# Altium footprint library PBL - THD Packages.PcbLib: 256 footprints (part 9 of 16)
Each footprint in its own frame and in the unit in brackets; x right, y up, seen from the top. Pads: shape width x height; smd on the part's side, far side on the other; paste and mask are expansions set on the pad; w line width, h text height; cw(c..) or ccw(c..) is an arc to the next point about the centre after c.
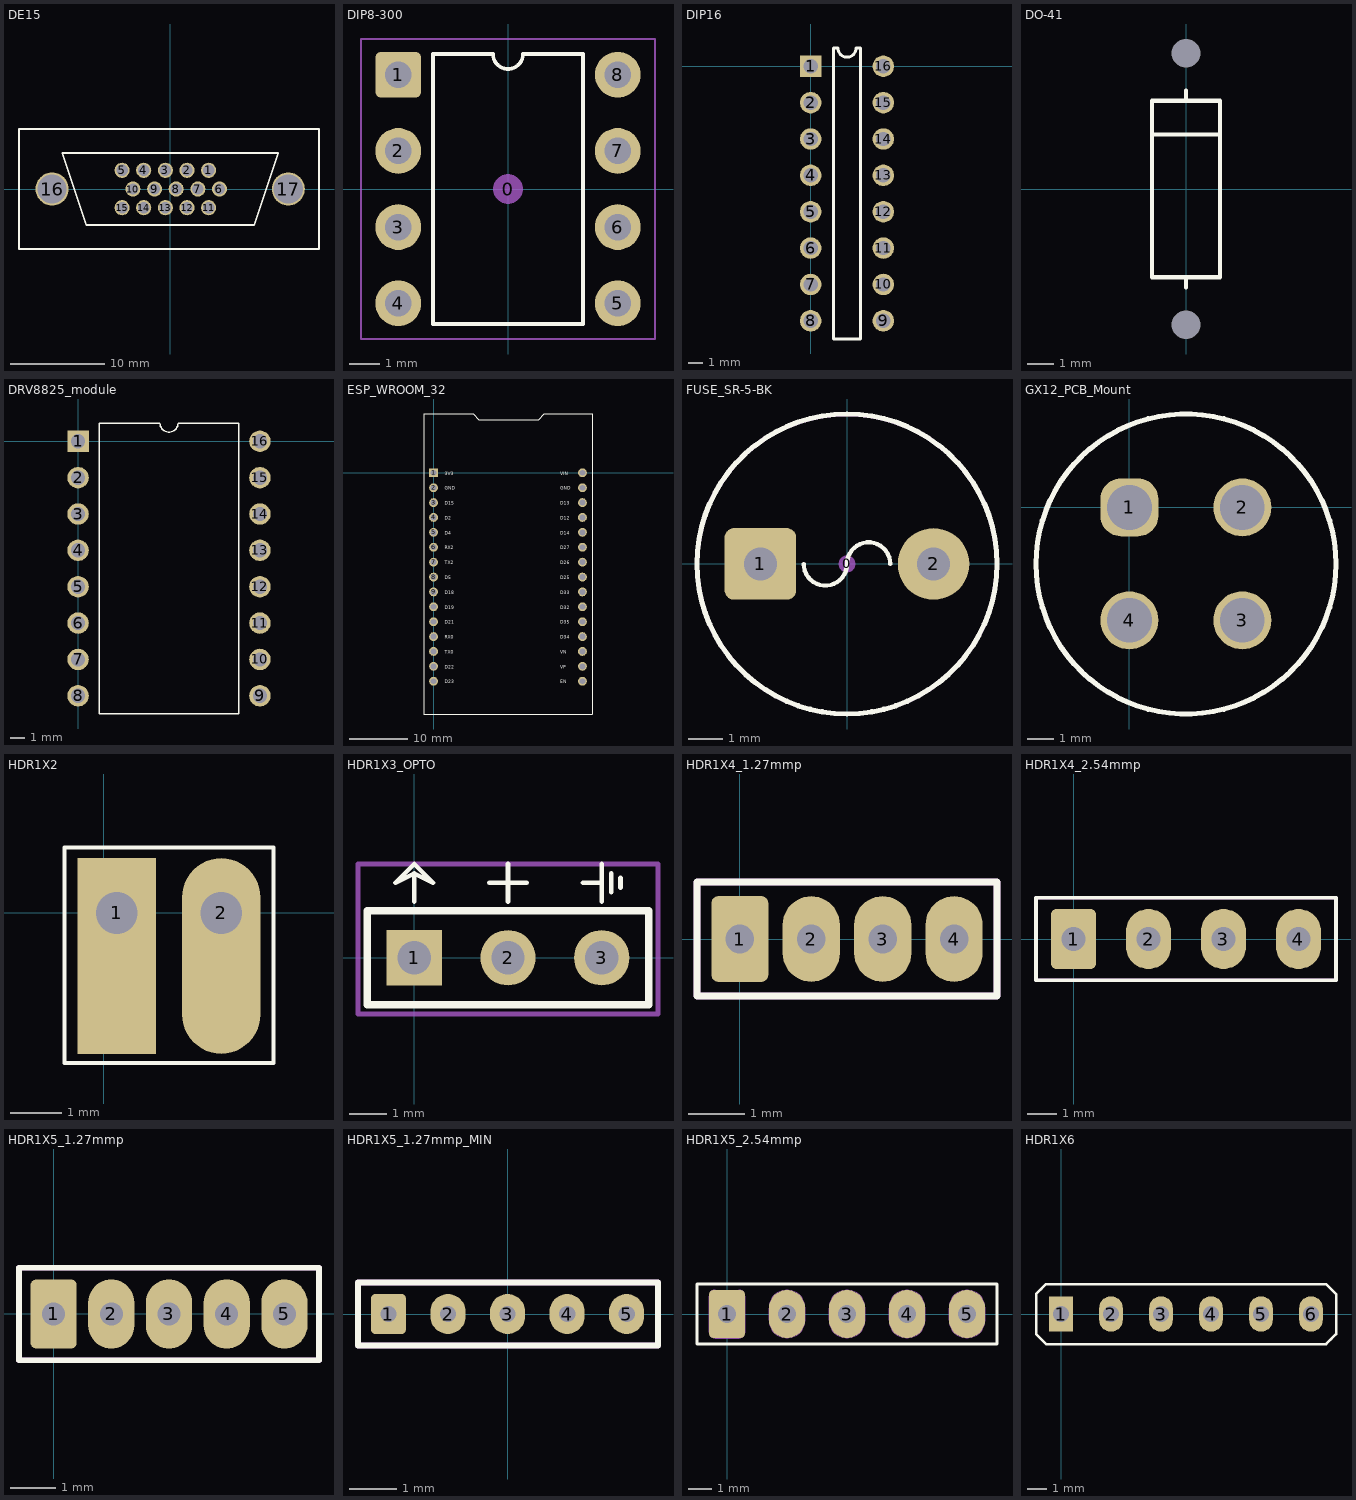
[diagram p8: the footprints below, top view; thin cyan lines are the x and y axes]

## DE15 [mm] "DE15 connector"
pads (17):
  round 1.6 hole 1.2: 1(4.07,1.98) 2(1.78,1.98) 3(-0.51,1.98) 4(-2.8,1.98) 5(-5.09,1.98) 6(5.215,0) 7(2.925,0) 8(0.635,0) 9(-1.655,0) 10(-3.945,0) 11(4.07,-1.98) 12(1.78,-1.98) 13(-0.51,-1.98) 14(-2.8,-1.98) 15(-5.09,-1.98)
  round 3.5 hole 3.1: 16(-12.5,0) 17(12.5,0)
Top Overlay:
  lines w0.2: -11.43,3.81 11.43,3.81 8.89,-3.81 -8.89,-3.81 -11.43,3.81
  lines w0.254: -16.002,-6.35 15.748,-6.35 15.748,6.35 -16.002,6.35 -16.002,-6.35

## DIP8-300 [mil] "DIP, 8-Leads, 0.300\" lead span , 0.100\" lead pitch, IPC Density A"
height 210
pads (9):
  round 39.37 on Mech15: 0(0,0)
  rrect25% 60x60 hole 35: 1(-144,150)
  round 60 hole 35: 2(-144,50) 3(-144,-50) 4(-144,-150) 5(144,-150) 6(144,-50) 7(144,50) 8(144,150)
Top Overlay:
  lines w5: -98.43,-177.17 98.43,-177.17 98.43,177.17 19.69,177.17 cw(c0,177.17) -19.69,177.17 -98.43,177.17 -98.43,-177.17
13 - 3D Top Side:
  lines w3: -98.43,-177.17 -98.43,177.17 -19.69,177.17 ccw(c0,177.17) 19.69,177.17 98.43,177.17 98.43,-177.17 -98.43,-177.17
15 - Top Courtyards:
  lines w3: -192.91,-196.85 192.91,-196.85 192.91,196.85 -192.91,196.85 -192.91,-196.85
3D body "SW3DPS-DIP8-DEFAULT.STEP": height 165, standoff -105, extent -149,-225 161,225

## DIP16 [mm]
pads (16):
  rect 1.5x1.5 hole 1: 1(0,0)
  round 1.5 hole 1: 2(0,-2.54) 3(0,-5.08) 4(0,-7.62) 5(0,-10.16) 6(0,-12.7) 7(0,-15.24) 8(0,-17.78) 9(5.08,-17.78) 10(5.08,-15.24) 11(5.08,-12.7) 12(5.08,-10.16) 13(5.08,-7.62) 14(5.08,-5.08) 15(5.08,-2.54) 16(5.08,0)
Top Overlay:
  lines w0.2: 1.585,-19.05 1.585,1.27 1.905,1.27 ccw(c2.54,1.27) 3.175,1.27 3.495,1.27 3.495,-19.05 1.585,-19.05

## DO-41 [mil] "Diode, thru-hole"
height 106.3
pads (2):
  round 0 / inner round 0 / far side round 100 hole 42 unplated: A(0,-200) K(0,200)
Top Overlay:
  lines w6: -50,80 50,80 ; 0,-145 0,-130 ; 0,130 0,145 ; -50,-130 -50,130 50,130 50,-130 -50,-130
3D body "DIODE0_4-DEFAULT.STEP": height 100.5, standoff -100, extent -51,-215 50,215

## DRV8825_module [mm]
pads (16):
  rect 1.5x1.5 hole 1: 1(0,0)
  round 1.5 hole 1: 2(0,-2.54) 3(0,-5.08) 4(0,-7.62) 5(0,-10.16) 6(0,-12.7) 7(0,-15.24) 8(0,-17.78) 9(12.7,-17.78) 10(12.7,-15.24) 11(12.7,-12.7) 12(12.7,-10.16) 13(12.7,-7.62) 14(12.7,-5.08) 15(12.7,-2.54) 16(12.7,0)
Top Overlay:
  lines w0.1: 1.485,-19.05 11.215,-19.05 11.215,1.27 6.985,1.27 cw(c6.35,1.27) 5.715,1.27 1.485,1.27 1.485,-19.05
3D body "DRV8825-PBS-8x2-RADIATOR.stp": height 17.43, standoff -2.56, extent -1.205,-19.05 13.795,1.27

## ESP_WROOM_32 [mm] "ESP WROOM 32 SHIELD pinout"
pads (30):
  rect 1.5x1.5 / inner rect 1.2x1.2 / far side rect 1.5x1.5 hole 1: 1(0,0)
  round 1.5 / inner round 1.2 / far side round 1.5 hole 1: 2(0,-2.54) 3(0,-5.08) 4(0,-7.62) 5(0,-10.16) 6(0,-12.7) 7(0,-15.24) 8(0,-17.78) 9(0,-20.32) 10(0,-22.86) 11(0,-25.4) 12(0,-27.94) 13(0,-30.48) 14(0,-33.02) 15(0,-35.56) 16(25.4,-35.56) 17(25.4,-33.02) 18(25.4,-30.48) 19(25.4,-27.94) 20(25.4,-25.4) 21(25.4,-22.86) 22(25.4,-20.32) 23(25.4,-17.78) 24(25.4,-15.24) 25(25.4,-12.7) 26(25.4,-10.16) 27(25.4,-7.62) 28(25.4,-5.08) 29(25.4,-2.54) 30(25.4,0)
Top Overlay:
  lines w0.1: -1.651,-41.148 -1.651,10.033 6.731,10.033 7.747,9.017 17.907,9.017 18.923,10.033 27.051,10.033 27.051,-41.148 -1.651,-41.148
  text "3V3" at 1.905,-0.635 h1
  text "GND" at 1.905,-3.175 h1
  text "D15" at 1.905,-5.715 h1
  text "D2" at 1.905,-8.255 h1
  text "D4" at 1.905,-10.795 h1
  text "RX2" at 1.905,-13.335 h1
  text "TX2" at 1.905,-15.875 h1
  text "D5" at 1.905,-18.415 h1
  text "D18" at 1.905,-20.955 h1
  text "D19" at 1.905,-23.495 h1
  text "D21" at 1.905,-26.035 h1
  text "RX0" at 1.905,-28.575 h1
  text "TX0" at 1.905,-31.115 h1
  text "D22" at 1.905,-33.655 h1
  text "D23" at 1.905,-36.195 h1
  text "EN" at 21.59,-36.195 h1
  text "VP" at 21.59,-33.655 h1
  text "VN" at 21.59,-31.115 h1
  text "D34" at 21.59,-28.575 h1
  text "D35" at 21.59,-26.035 h1
  text "D32" at 21.59,-23.495 h1
  text "D33" at 21.59,-20.955 h1
  text "D25" at 21.59,-18.415 h1
  text "D26" at 21.59,-15.875 h1
  text "D27" at 21.59,-13.335 h1
  text "D14" at 21.59,-10.795 h1
  text "D12" at 21.59,-8.255 h1
  text "D13" at 21.59,-5.715 h1
  text "GND" at 21.59,-3.175 h1
  text "VIN" at 21.59,-0.635 h1
3D body "ESP-WROOM32.STEP": height 7.1, standoff -5.3, extent -1.576,-41.021 26.924,9.909

## FUSE_SR-5-BK [mm]
height 9.3
pads (3):
  round 0.5 on Mech15: 0(0,0)
  rrect25% 2.1x2.1 hole 0.965: 1(-2.54,0)
  round 2.1 hole 0.965: 2(2.54,0)
Top Overlay:
  circle w0.152: c0,0 r4.4
  lines w0.127: -1.27,0 ccw(c-0.635,0) 0,0 cw(c0.635,0) 1.27,0
13 - 3D Top Side:
  circle w0.127: c0,-0.003 r4.4
3D body "Fuse_SR-5-BK.STEP": height 8.29, standoff -2.55, extent -4.35,-4.321 4.35,4.315

## GX12_PCB_Mount [mm] "M12 connector pcb mounting"
pads (4):
  rrect70% 2.2x2.2 hole 1.7: 1(0,0)
  round 2.2 / inner round 1.9 / far side round 2.2 hole 1.7: 2(4.29,0) 3(4.29,-4.29) 4(0,-4.29)
Top Overlay:
  circle w0.2: c2.15,-2.15 r5.7

## HDR1X2 [mil] "Connector; Header; 2 Position"
pads (2):
  rect 60x150 hole 32 copper offset 0,-33: 1(10,0)
  oval 60x150 hole 32 copper offset 0,-33: 2(90,0)
Top Overlay:
  lines w3: -30,-115 -30,50 130,50 130,-115 -30,-115

## HDR1X3_OPTO [mm] "Connector; Header; 3 Position"
pads (3):
  rect 1.5x1.5 hole 0.9: 1(0,0)
  round 1.5 hole 0.9: 2(2.54,0) 3(5.08,0)
Top Overlay:
  lines w0.127: 0,1.524 0,2.286 ; 2.032,2.032 3.048,2.032 ; 2.54,1.524 2.54,2.54 ; 4.572,2.032 5.08,2.032 5.08,2.54 5.08,1.524 ; 5.334,1.778 5.334,2.286 ; 5.588,1.905 5.588,2.159 ; 0,2.286 -0.508,2.032 0,2.54 0.508,2.032 0,2.286
  lines w0.2: -1.27,-1.27 -1.27,1.27 6.35,1.27 6.35,-1.27 -1.27,-1.27
15 - Top Courtyards:
  lines w0.127: -1.524,-1.524 -1.524,2.54 6.604,2.54 6.604,-1.524 -1.524,-1.524

## HDR1X4_1.27mmp [mil] "Connector; Header; 4 Position, 0.050\" pitch"
pads (4):
  rrect25% 40x60 hole 20: 1(0,0)
  oval 40x60 hole 20: 2(50,0) 3(100,0) 4(150,0)
Top Overlay:
  lines w5: -30,-40 -30,40 180,40 180,-40 -30,-40
13 - 3D Top Side:
  lines w5: -30,-40 -30,40 180,40 180,-40 -30,-40

## HDR1X4_2.54mmp [mil] "Connector; Header; 4 Position 0.100\" pitch"
pads (4):
  rrect25% 60x80 hole 32: 1(0,0)
  oval 60x80 hole 32: 2(100,0) 3(200,0) 4(300,0)
Top Overlay:
  lines w5: -50,-55 -50,55 350,55 350,-55 -50,-55
13 - 3D Top Side:
  lines w5: -50,-55 350,-55 350,55 -50,55 -50,-55

## HDR1X5_1.27mmp [mil] "Connector; Header; 5 Position, 0.050\" pitch"
pads (5):
  rrect25% 40x60 hole 20 mask+5: 1(0,0)
  oval 40x60 hole 20 mask+5: 2(50,0) 3(100,0) 4(150,0) 5(200,0)
Top Overlay:
  lines w5: -30,-40 -30,40 230,40 230,-40 -30,-40
13 - 3D Top Side:
  lines w5: -30,-40 -30,40 230,40 230,-40 -30,-40
3D body: height -3, standoff -5, extent -19.84,-19.96 20,19.96

## HDR1X5_1.27mmp_MIN [mm] "Programming connector target; 5 Position with minimally sized pads, 0.050\" pitch"
pads (5):
  rrect25% 0.75x0.85 hole 0.35 mask+0.1: 1(-2.54,0)
  oval 0.75x0.85 hole 0.35 mask+0.1: 2(-1.27,0) 3(0,0) 4(1.27,0) 5(2.54,0)
Top Overlay:
  lines w0.127: -3.19,-0.675 3.21,-0.675 3.21,0.675 -3.19,0.675 -3.19,-0.675
13 - 3D Top Side:
  lines w0.127: -3.19,-0.675 3.21,-0.675 3.21,0.675 -3.19,0.675 -3.19,-0.675
3D body: height -0.08, standoff -0.13, extent -3.044,-0.507 -2.032,0.507

## HDR1X5_2.54mmp [mil] "Connector; Header; 5 Position 0.100\" pitch"
pads (5):
  rrect25% 60x80 hole 30: 1(0,0)
  oval 60x80 hole 30: 2(100,0) 3(200,0) 4(300,0) 5(400,0)
Top Overlay:
  lines w5: -50,-50 450,-50 450,50 -50,50 -50,-50
13 - 3D Top Side:
  circle w1.97: c400,0 r15
  circle w1.97: c300,0 r15
  circle w1.97: c200,0 r15
  circle w1.97: c100,0 r15
  circle w1.97: c0,0 r15
  lines w1.97: -30,-30 ccw(c-20,-30) -20,-40 20,-40 ccw(c20,-30) 30,-30 30,30 ccw(c20,30) 20,40 -20,40 ccw(c-20,30) -30,30 -30,-30 ; 70,-10 ccw(c100,-10) 130,-10 130,10 ccw(c100,10) 70,10 70,-10 ; 170,-10 ccw(c200,-10) 230,-10 230,10 ccw(c200,10) 170,10 170,-10 ; 270,-10 ccw(c300,-10) 330,-10 330,10 ccw(c300,10) 270,10 270,-10 ; 370,-10 ccw(c400,-10) 430,-10 430,10 ccw(c400,10) 370,10 370,-10

## HDR1X6 [mm] "Connector; Header; 6 Position"
pads (6):
  rect 1.2x1.8 hole 0.813: 1(0,0)
  oval 1.2x1.8 hole 0.813: 2(2.54,0) 3(5.08,0) 4(7.62,0) 5(10.16,0) 6(12.7,0)
Top Overlay:
  lines w0.127: -1.27,-1.016 -0.762,-1.524 13.462,-1.524 13.716,-1.27 13.97,-1.016 13.97,1.016 13.716,1.27 13.462,1.524 -0.762,1.524 -1.016,1.27 -1.27,1.016 -1.27,-1.016
13 - 3D Top Side:
  lines w0.076: -1.016,-1.27 -1.27,-1.016 -1.27,1.016 -1.016,1.27 ; 13.716,-1.27 13.97,-1.016 13.97,1.016 13.716,1.27